# Altium integrated library EFR_Lib.IntLib: 430 symbols (part 1 of 6) (continued)
## CON-04-WE-MPC3-66200411122
designator J?, comment 66200411122
WR-MPC3 THT Male Vertical Header, pitch 3mm, 4p; Manufacturer: Würth Elektronik; Contact Resistance: 10mΩ; Insulation Resistance: >1000MΩ; Rated Current: 5A; Working Voltage: 250VAC; ComponentLink1Description: Website Link; ComponentLink1URL: https://www.we-online.com/redexpert/article/66200411122?ad; ComponentLink2Description: Datasheet Link; ComponentLink2URL: https://www.we-online.com/redexpert/spec/66200411122?ad; Manufacturer P/N: 66200411122; Category: Wire-to-Board Connectors; Match Code: WR-MPC3; Mounting Technology: THT; Operating Temperature Max: 105°C; Operating Temperature Min: -40°C; Packaging: Tube; Length: 15.65mm; Width: 5.57mm; Height: 11mm; Gender: Male; Number of Pins: 4; Number of Rows: 1; Orientation: Vertical; Pitch: 3mm
footprint 66200411122 (3.00mm Male Single Row Vertical Header, 4p)
pins: 1, 2, 3, 4

## CON-04-WE-MPC3-66200421122
designator J?, comment WR-MPC3
THT Male Header WR-MPC3, Vertical, Dual Row, pitch 3 mm, 4 pins; Manufacturer P/N: 66200421122; Manufacturer: Würth Elektronik; Pitch: 3 mm; Working Voltage: 250 VAC; Contact Resistance: 10 mOhm; PinNumber: 4; ComponentLink1Description: Manufacturer; ComponentLink1URL: http://www.we-online.de; ComponentLink2Description: Datasheet; ComponentLink2URL: https://katalog.we-online.de/em/datasheet/6620xx21122.pdf; Published Date: September 2018; Operating Temperature: -40 to 105 degC; Packaging: Tube; Gender: Male; Mounting Technology: THT; Orientation: Vertical
footprint CON-04-WE-66200421122 (Dual row Vertical header 04p)
pins: 1, 2, 3, 4

## CON-04-WE-MPC4-64900411122
designator J?, comment 64900411122
WR-MPC4 THT Male Vertical Header, pitch 4.2mm, 4p; Manufacturer: Würth Elektronik; Contact Resistance: 10mΩ; Insulation Resistance: 1000MΩ; Rated Current: 9A; Working Voltage: 600VAC; ComponentLink1Description: Website Link; ComponentLink1URL: https://www.we-online.com/redexpert/article/64900411122?ad; ComponentLink2Description: Datasheet Link; ComponentLink2URL: https://www.we-online.com/redexpert/spec/64900411122?ad; Manufacturer P/N: 64900411122; Category: Wire-to-Board Connectors; Match Code: WR-MPC4; Mounting Technology: THT; Operating Temperature Max: 105°C; Operating Temperature Min: -40°C; Packaging: Tray; Gender: Male; Number of Pins: 4; Number of Rows: 1; Orientation: Vertical; Pitch: 4.2mm
footprint 64900411122
pins: 1, 2, 3, 4

## CON-04-WE-MPC4-64900421122
designator J?, comment MPC4 Vert.
WR-MPC4 4.2mm Male Dual Row Vertical Header, 4p; Manufacturer P/N: 64900421122; Manufacturer: Würth Elektronik; Working Voltage: 600VAC; Contact Resistance: 10mOhm; Pin Number: 4; ComponentLink1Description: Manufacturer; ComponentLink1URL: http://www.we-online.de; ComponentLink2Description: Datasheet; ComponentLink2URL: https://www.we-online.com/catalog/datasheet/64900421122.pdf; Published Date: March 2020; Pitch: 4.2mm; Operating Temperature: -40 to +105degC; Packaging: Tray; Gender: Male; Mounting Technology: THT; Type: Vertical; Row Number: Dual
footprint CON-WE-64900421122 (4.20mm Male Dual Row Vertical Header, 4p)
pins: 1, 2, 3, 4

## CON-04-WE-PHD-62000411821
designator J?, comment PHD
WR-PHD Socket Header, THT, pitch 2mm, Single Row, Vertical, 4p; Manufacturer P/N: 62000411821; Manufacturer: Würth Elektronik; Pin Number: 4; Rated Current: 2A; Working Voltage: 250VAC; Withstanding Voltage: 500VAC; Contact Resistance: 20mOhm; ComponentLink1Description: Manufacturer; ComponentLink1URL: http://www.we-online.de; ComponentLink2Description: Datasheet; ComponentLink2URL: https://www.we-online.com/catalog/datasheet/62000411821.pdf; Published Date: May 2020; Pitch: 2mm; Operating Temperature: -40 to +105degC; Mounting Technology: THT; Packaging: Tube; Gender: Socket Header; Row Number: Single; Orientation: Vertical
footprint CON-04-WE-PHD-62000411821 (Footprint not found)
pins: 1, 2, 3, 4

## CON-04-WE-PHD-62200421121
designator J?, comment PHD, 1.27mm
WR-PHD Pin Header, THT, pitch 1.27mm, Dual Row, Vertical, 4p; Manufacturer P/N: 62200421121; Manufacturer: Würth Elektronik; Pin Number: 4; Rated Current: 1A; Working Voltage: 100VAC; Withstanding Voltage: 500VAC; Contact Resistance: 20mOhm; ComponentLink1Description: Manufacturer; ComponentLink1URL: http://www.we-online.de; ComponentLink2Description: Datasheet; ComponentLink2URL: https://www.we-online.com/catalog/datasheet/62200421121.pdf; Published Date: May 2020; Pitch: 1.27mm; Operating Temperature: -40 to +105degC; Mounting Technology: THT; Packaging: Box; Gender: Pin Header; Row Number: Dual; Orientation: Vertical
footprint CON-04-WE-62200421121 (Pin Header, pitch 1.27 mm, THT, Vertical, dual row, 4p)
pins: 1, 2, 3, 4

## CON-04-WE-TBL-691244510004
designator J?, comment 691244510004
WR-TBL Series 2445 Horizontal Entry Modular, Through Hole, pitch 5.08mm, 4p; Manufacturer: Würth Elektronik; Pin Number: 4; Rated Current: 16A; Working Voltage: 300V; PCB/Cable/Panel: PCB; Modularity: No; ComponentLink1Description: Manufacturer Link; ComponentLink1URL: https://www.we-online.com/redexpert/article/691244510004?ad; ComponentLink2Description: Datasheet; ComponentLink2URL: https://www.we-online.com/redexpert/spec/691244510004?ad; Category: Terminal Blocks; Match Code: WR-TBL; Manufacturer P/N: 691244510004; Mounting Technology: THT; Operating Temperature Max: 120°C; Operating Temperature Min: -30°C; Packaging: Box; Pitch: 5.08mm; Orientation: Horizontal; Application: Rising Cage Clamp
footprint CON-04-WE-691244510004 (Serie 2445 - 5.08 mm _ 4 pins)
pins: 1, 2, 3, 4

## CON-04-WE-WTB-62000411722
designator J?, comment WR-WTB
Male Shrouded Header WR-WTB, THT, Right Angled, pitch 2 mm, 1 x 4 position; Manufacturer: Würth Elektronik; Manufacturer P/N: 62000411722; Pitch: 2mm; Working Voltage: 125VAC; Position: 1x4; Contact Resistance: 20mOhm; PinNumber: 4; Gender: Male; Datasheet URL: https://katalog.we-online.de/em/datasheet/6200xx11722.pdf; Orientation: RightAngled; Mounting Technology: THT; Operating Temperature: -25to85degC; Publisher: WurthElektronik; ComponentLink1Description: Hersteller; ComponentLink1URL: https://katalog.we-online.de/de/em/WTB_2_00_MALE_HORIZONTAL_SHROUDED_HEADER_6200XX11722; ComponentLink2Description: Datenblatt; ComponentLink2URL: https://katalog.we-online.de/em/datasheet/6200xx11722.pdf
footprint CON-04-WE-62000411722 (2.00mm Male Horizontal Shrouded Header, 4p)
pins: 1, 2, 3, 4

## CON-05-EDAC-560-005-420-101
designator J?, comment EDAC 560
THT White Male 560 Series Waterproof Connector with Plastic Pegs, Vertical, Single Row, pitch 2.5 mm, 5 pins; Manufacturer P/N: 560-005-420-101; Pitch: 2.5 mm; Working Voltage: 250 V; Contact Resistance: 15 mOhm; PinNumber: 5; Current: 3A; ComponentLink1Description: Manufacturer; ComponentLink1URL: https://edac.net/series/560; ComponentLink2Description: Datasheet; ComponentLink2URL: https://files.edac.net/edac/content/560/560-005-420-101%20-%20EDAC%20E-SEAL%20Waterproof%20Connector.PDF; Manufacturer: EDAC; Operating Temperature: -40 to 105 °C; Gender: Male; Mounting Technology: THT; Orientation: Vertical; Supplier 1: Mouser; Supplier 2: Digi-Key; Supplier Part Number 1: 587-560-005-420-101; Supplier Part Number 2: 151-1552-ND
footprint CON-05-EDAC_560-005-420-101 (EDAC 560 SERIES WATERPROOF CONNECTOR 5 Pin)
pins: 1, 2, 3, 4, 5

## CON-05-EDAC-560-005-420-301
designator J?, comment EDAC 560
THT Blue Male 560 Series Waterproof Connector with Plastic Pegs, Vertical, Single Row, pitch 2.5 mm, 5 pins; Manufacturer P/N: 560-005-420-301; Pitch: 2.5 mm; Working Voltage: 250 V; Contact Resistance: 15 mOhm; PinNumber: 5; Current: 3A; ComponentLink1Description: Manufacturer; ComponentLink1URL: https://edac.net/series/560; ComponentLink2Description: Datasheet; ComponentLink2URL: https://files.edac.net/edac/content/560/560-005-420-301%20-%20EDAC%20E-SEAL%20Waterproof%20Connector.PDF; Manufacturer: EDAC; Operating Temperature: -40 to 105 °C; Gender: Male; Mounting Technology: THT; Orientation: Vertical; Supplier 1: Mouser; Supplier 2: Digi-Key; Supplier Part Number 1: 587-560-005-420-301; Supplier Part Number 2: 151-1553-ND
footprint CON-05-EDAC_560-005-420-101 (EDAC 560 SERIES WATERPROOF CONNECTOR 5 Pin)
pins: 1, 2, 3, 4, 5

## CON-05-WE-WTB-62000511722
designator J?, comment WR-WTB Horiz.
Male Shrouded Header WR-WTB, THT, Right Angled, pitch 2 mm, 1 x 5 position; Manufacturer: Würth Elektronik; Manufacturer P/N: 62000511722; Pitch: 2mm; Contact Resistance: 20mOhm; Position: 1x5; Working Voltage: 125VAC; PinNumber: 5; Package Reference: 62000511722; Gender: Male; Packaging: Bag; Datasheet URL: https://katalog.we-online.de/em/datasheet/6200xx11722.pdf; Orientation: RightAngled; Manufacturer URL: http://www.we-online.de; Operating Temperature: -25to85degC; Publisher: WurthElektronik; Mounting Technology: THT
footprint CON-05-62000511722 (2.00mm Male Horizontal Shrouded Header, 5p)
pins: 1, 2, 3, 4, 5

## CON-06-Amphenol-67997-106HLF
designator J?, comment HDR 2x3
CONN HEADER 6POS .100 STR 30AU; Manufacturer: Amphenol FCI; Manufacturer P/N: 67997-106HLF; Number of Contacts: 6; Insulation Resistance: 5GR; Max Voltage Rating (AC): 1.5kV; Gender: Male; Current Rating: 3A; Connector Type: Male Pin; Pitch: 2.54mm; Row Spacing: 0.1inch; Contact Post Length: 3.05mm; RoHS: Yes; Category: Headers and Wire Housings; Stock 1: 1387; Pricing 1: 1=1,78000, 10=1,61400, 100=1,38370, 500=1,15308, 1000=0,98835, 5000=0,87634, 10000=0,85657 (USD); Mounting Technology: THT; Contact Plating: Gold,GXT; Housing Color: Black; Contact Material: Bronze; Color: Black; Housing Material: Thermoplastic; Min Operating Temperature: -65°C; Max Operating Temperature: 125°C; Termination: Through Hole; Number of Rows: 2; Orientation: Straight; Number of Positions: 6; Packaging: Bulk; Package Quantity: 100; Contact Gender: Male; Voltage Rating: 1.5kV; Length: 7.62mm; Contact Mating Length: 0.23inch; Depth: 4.83mm; Radiation Hardening: No; Lead Free: Lead Free; REACH SVHC: No SVHC; Flammability Rating: UL94 V-0; ComponentLink1URL: https://datasheet.ciiva.com/5153/67996-222463-5153820.pdf?src-supplier=Mouser; ComponentLink1Description: https://datasheet.ciiva.com/5153/67996-222463-5153820.pdf?src-supplier=Mouser; ComponentLink2URL: https://datasheet.ciiva.com/16726/67996-16726286.pdf?src-supplier=Avnet+Europe; ComponentLink2Description: https://datasheet.ciiva.com/16726/67996-16726286.pdf?src-supplier=Avnet+Europe; ComponentLink3URL: https://datasheet.ciiva.com/722/67996-722044.pdf?src-supplier=Digi-Key; ComponentLink3Description: https://datasheet.ciiva.com/722/67996-722044.pdf?src-supplier=Digi-Key; ComponentLink4URL: https://datasheet.ciiva.com/10149/67996-10149221.pdf?src-supplier=Avnet; ComponentLink4Description: https://datasheet.ciiva.com/10149/67996-10149221.pdf?src-supplier=Avnet; ComponentLink5URL: https://datasheet.ciiva.com/46393/1876884-46393067.pdf?src-supplier=Element14; ComponentLink5Description: https://datasheet.ciiva.com/46393/1876884-46393067.pdf?src-supplier=Element14; Supplier 1: Digi-Key; Supplier Part Number 1: 609-3393-ND
footprint HDR_2x3_2.55mm
pins: 1, 2, 3, 4, 5, 6

## CON-06-SAMTEC-FTS-103-01-X-D
designator J?, comment FTS-103-01-X-D
Micro Low Profile Header Strips; Manufacturer: Samtec Inc.; Package: None; Manufacturer P/N: FTS-103-01-X-D; Value: *; Availability: Unavailable; Price: None; ComponentLink1Description: Manfacturer; ComponentLink1URL: https://www.samtec.com/products/fts-103-01-l-d; ComponentLink2Description: Datasheet; ComponentLink2URL: https://suddendocs.samtec.com/prints/fts-1xx-xx-xx-xx-xx-x-xx-mkt.pdf; ComponentLink3Description: Product Series; ComponentLink3URL: https://www.samtec.com/products/fts; Mounting Technology: THT
footprint CON-06-SAMTEC-FTS-103-01-X-D
pins: 1, 2, 3, 4, 5, 6

## CON-06-WE-MPC3-66200611022
designator J?, comment 66200611022
WR-MPC3 THT Male Right Angled Header with Plastic Pegs, pitch 3mm, 6p; Manufacturer: Wurth Elektronik; Contact Resistance: 10mOhm; Insulation Resistance: >1000MOhm; Rated Current: 5A; Working Voltage: 250V (AC); Match Code: WR-MPC3; ComponentLink1Description: Website Link; ComponentLink1URL: https://www.we-online.com/redexpert/article/66200611022?ad; ComponentLink2Description: Datasheet Link; ComponentLink2URL: https://www.we-online.com/redexpert/spec/66200611022?ad; Mount: Through Hole; Operating Temperature Max: 105°C; Operating Temperature Min: -40°C; Packaging: Tube; Length: 21.65mm; Width: 9.9mm; Height: 5.57mm; Gender: Male; Number of Pins: 6; Number of Rows: 1; Orientation: Right Angled; Pitch: 3mm; Manufacturer P/N: 66200611022
footprint 66200611022 (3.00mm Male Single Row Angled Header with Plastic Pegs, 6p)
pins: 1, 2, 3, 4, 5, 6

## CON-06-WE-MPC3-66200621122
designator J?, comment WR-MPC3 Vert.
THT Male Header WR-MPC3, Vertical, Dual Row, pitch 3 mm, 6 pins; Manufacturer: Würth Elektronik; Manufacturer P/N: 66200621122; Pitch: 3mm; PinNumber: 6; Working Voltage: 250VAC; Contact Resistance: 10mOhm; Datasheet URL: https://katalog.we-online.de/em/datasheet/6620xx21122.pdf; Orientation: Vertical; Publisher: WurthElektronik; Package Reference: 66200621122; Operating Temperature: -40to105degC; Gender: Male; Manufacturer URL: http://www.we-online.de; Mounting Technology: THT; ComponentLink1Description: Hersteller; ComponentLink1URL: https://katalog.we-online.de/de/em/MPC3_3_00_MALE_DUAL_ROW_VERTICAL_HEADER_6620XX21122; ComponentLink2Description: Datenblatt; ComponentLink2URL: https://katalog.we-online.de/em/datasheet/6620xx21122.pdf
footprint CON-06-WE-66200621122 (Dual row Vertical header 06p)
pins: 1, 2, 3, 4, 5, 6

## CON-06-WE-MPC4-64900621122
designator J?, comment WR-MPC4 Vert.
THT Male Header WR-MPC4, Vertical, Dual Row, pitch 4.2 mm, 6 pins; Manufacturer P/N: 64900621122; Manufacturer: Würth Elektronik; Pitch: 4.2 mm; Working Voltage: 600 VAC; Contact Resistance: 10 mOhm; PinNumber: 6; ComponentLink1Description: Manufacturer; ComponentLink1URL: http://www.we-online.de; ComponentLink2Description: Datasheet; ComponentLink2URL: https://katalog.we-online.de/em/datasheet/6490xx21122.pdf; Published Date: September 2018; Operating Temperature: -40 to 105 degC; Packaging: Tray; Gender: Male; Mounting Technology: THT; Orientation: Vertical; Resistance: *; Tolerance: *; Capacitance: *; Power (W): *; Current (A): *; Voltage (V): *; Value: *; Parameter 3: *
footprint CON-06-WE-64900621122 (4.20mm Male Dual Row Vertical Header, 6p)
pins: 1, 2, 3, 4, 5, 6

## CON-06-WE-PHD-62000611821
designator J?, comment WR-PHD 2mm
WR-PHD Socket Header, THT, Vertical, pitch 2mm, 1 Row, 6P; Manufacturer P/N: 62000611821; Manufacturer: Würth Elektronik; Contact Resistance: 20mΩ; Rated Current: 2A; Working Voltage: 250V; Withstanding Voltage: 500V; ComponentLink1Description: Website Link; ComponentLink1URL: https://www.we-online.com/redexpert/article/62000611821?ad; ComponentLink2Description: Datasheet Link; ComponentLink2URL: https://www.we-online.com/redexpert/spec/62000611821?ad; Category: Board-to-Board Connectors; Match Code: WR-PHD; Mounting Technology: THT; Operating Temperature Max: 105°C; Operating Temperature Min: -40°C; Packaging: Tube; Gender: Socket Header; Number of Pins: 6; Number of Rows: 1; Orientation: Vertical; Pitch: 2mm
footprint 62000611821
pins: 1, 2, 3, 4, 5, 6

## CON-07-WE-MPC3-66200711022
designator J?, comment 66200711022  (value not drawn)
WR-MPC3 THT Male Right Angled Header with Plastic Pegs, pitch 3mm, 7p; Manufacturer: Wurth Elektronik; Contact Resistance: 10mOhm; Insulation Resistance: >1000MOhm; Rated Current: 5A; Working Voltage: 250V (AC); Manufacturer P/N: 66200711022; Match Code: WR-MPC3; ComponentLink1Description: Website Link; ComponentLink1URL: https://www.we-online.com/redexpert/article/66200711022?ad; ComponentLink2Description: Datasheet Link; ComponentLink2URL: https://www.we-online.com/redexpert/spec/66200711022?ad; Mount: Through Hole; Operating Temperature Max: 105°C; Operating Temperature Min: -40°C; Packaging: Tube; Length: 24.65mm; Width: 9.9mm; Height: 5.57mm; Gender: Male; Number of Pins: 7; Number of Rows: 1; Orientation: Right Angled; Pitch: 3mm
footprint 66200711022 (3.00mm Male Single Row Angled Header with Plastic Pegs, 7p)
pins: 1, 2, 3, 4, 5, 6, 7

## CON-08-WE-MPC3-66200811024
designator J?, comment 66200811024  (value not drawn)
WR-MPC3 THT Male Header Single Row Right Angled with Plastic Pegs (Selective Gold), pitch 3mm, 8p; Manufacturer: Wurth Elektronik; Contact Resistance: 10mOhm; Insulation Resistance: >1000MOhm; Rated Current: 5A; Working Voltage: 250V (AC); Manufacturer P/N: 66200811024; Match Code: WR-MPC3; ComponentLink1Description: Website Link; ComponentLink1URL: https://www.we-online.com/redexpert/article/66200811024?ad; ComponentLink2Description: Datasheet Link; ComponentLink2URL: https://www.we-online.com/redexpert/spec/66200811024?ad; Mount: Through Hole; Operating Temperature Max: 105°C; Operating Temperature Min: -40°C; Packaging: Tube; Gender: Male; Number of Pins: 8; Number of Rows: 1; Orientation: Right Angled; Pitch: 3mm
footprint 66200811024 (3.00mm Male Single Row Angled Header with Plastic Pegs, 8p)
pins: 1, 2, 3, 4, 5, 6, 7, 8

## CON-08-WE-MPC3-66200821022
designator J?, comment WR-MPC3 Horiz.
THT Male Header WR-MPC3, with Snap-in Plastic Pegs, Right Angled, Dual Row, pitch 3 mm, 8 pins; Manufacturer P/N: 66200821022; Manufacturer: Würth Elektronik; Pitch: 3 mm; Working Voltage: 250 VAC; Contact Resistance: 10 mOhm; Pin Number: 8; ComponentLink1Description: Manufacturer; ComponentLink1URL: http://www.we-online.de; ComponentLink2Description: Datasheet; ComponentLink2URL: https://katalog.we-online.de/em/datasheet/6620xx21022.pdf; Published Date: September 2018; Operating Temperature: -40 to 105 degC; Packaging: Tube; Gender: Male; Mounting Technology: THT; Orientation: Right Angled
footprint CON-08-WE-66200821022 (Dual row Right angle header With plastic peg 08p)
pins: 1, 2, 3, 4, 5, 6, 7, 8

## CON-08-WE-MPC3-66200821122
designator J?, comment WR-MPC3 Vert.
THT Male Header WR-MPC3, Vertical, Dual Row, pitch 3 mm, 8 pins; Manufacturer P/N: 66200821122; Manufacturer: Würth Elektronik; Pitch: 3 mm; Working Voltage: 250 VAC; Contact Resistance: 10 mOhm; Pin Number: 8; ComponentLink1Description: Manufacturer; ComponentLink1URL: https://www.we-online.de/katalog/de/MPC3_3_00_MALE_DUAL_ROW_VERTICAL_HEADER_6620XX21122/#66200821122; ComponentLink2Description: Datasheet; ComponentLink2URL: https://katalog.we-online.de/em/datasheet/6620xx21122.pdf; Operating Temperature: -40 to 105 degC; Packaging: Tube; Gender: Male; Mounting Technology: THT; Orientation: Vertical; Supplier 1: Mouser; Supplier Part Number 1: 710-66200821122
footprint CON-08-WE-66200821122 (Dual row Vertical header 08p)
pins: 1, 2, 3, 4, 5, 6, 7, 8

## CON-08-WE-MPC4-64900821122
designator J?, comment WR-MPC4 Vert.
THT Male Header WR-MPC4, Vertical, Dual Row, pitch 4.2 mm, 8 pins; Manufacturer P/N: 64900821122; Manufacturer: Würth Elektronik; Pitch: 4.2 mm; Working Voltage: 600 VAC; Contact Resistance: 10 mOhm; PinNumber: 8; ComponentLink1Description: Manufacturer; ComponentLink1URL: http://www.we-online.de; ComponentLink2Description: Datasheet; ComponentLink2URL: https://katalog.we-online.de/em/datasheet/6490xx21122.pdf; Published Date: September 2018; Operating Temperature: -40 to 105 degC; Gender: Male; Mounting Technology: THT; Orientation: Vertical
footprint CON-08-WE-64900821122 (Footprint not found)
pins: 1, 2, 3, 4, 5, 6, 7, 8

## CON-08-WE-WTB-62000811722
designator J?, comment WR-WTB Horiz.
WR-WTB THT Male Horizontal Shrouded Header, pitch 2mm, 8pins; Manufacturer P/N: 62000811722; Manufacturer: Würth Elektronik; Contact Resistance: 20mOhm; Rated Current: 2A; Working Voltage: 125VAC; Withstanding Voltage: 800VAC; ComponentLink1Description: Website Link; ComponentLink1URL: https://www.we-online.com/redexpert/article/62000811722?ad; ComponentLink2Description: Datasheet Link; ComponentLink2URL: https://www.we-online.com/redexpert/spec/62000811722?ad; Category: Wire-to-Board Connectors; Match Code: WR-WTB; Mounting Technology: THT; Operating Temperature Max: 85°C; Operating Temperature Min: -25°C; Packaging: Bag; Length: 18mm; Width: 7.6mm; Height: 4.5mm; Gender: Male; Number of Pins: 8; Number of Rows: 1; Orientation: Horizontal; Pitch: 2mm
footprint 61900819521 (2.54mm Male Right Angled Locking Header Top Locking, 8p)
pins: 1, 2, 3, 4, 5, 6, 7, 8

## CON-08-WE-WTB-62400821722
designator J?, comment WR-WTB vert.
WR-WTB THT Male Horizontal Shrouded Header with positive locking, Dual Row, pitch 2mm, 8pins; Manufacturer P/N: 62400821722; Manufacturer: Würth Elektronik; Contact Resistance: 20mOhm; Rated Current: 3A; Working Voltage: 250VAC; Withstanding Voltage: 1000VAC; ComponentLink1Description: Website Link; ComponentLink1URL: https://www.we-online.com/redexpert/article/62400821722?ad; ComponentLink2Description: Datasheet Link; ComponentLink2URL: https://www.we-online.com/redexpert/spec/62400821722?ad; Category: Wire-to-Board Connectors; Match Code: WR-WTB; Mounting Technology: THT; Operating Temperature Max: 85°C; Operating Temperature Min: -25°C; Packaging: Tube; Length: 11.4mm; Width: 14.5mm; Height: 11.7mm; Gender: Male; Number of Pins: 8; Number of Rows: 2; Orientation: Horizontal; Pitch: 2mm
footprint 62400821722
pins: 1, 2, 3, 4, 5, 6, 7, 8

## CON-09-DSUB-WE-618009231121
designator J?, comment DSUB Angled
WR-DSUB 8.08mm Female PCB Connector with Hex Screw, Angled, 9p; Manufacturer P/N: 618009231121; Manufacturer: Würth Elektronik; Pin Number: 9; Rated Current: 3A; Contact Resistance: 30mOhm; Working Voltage: 125VAC; Withstanding Voltage: 1000VAC; ComponentLink1Description: Manufacturer; ComponentLink1URL: https://www.we-online.com/en/components/products/DSUB_FEMALE_ANGLED_PCB_CONNECTOR_W_HEX_SCREW_8_08MM_6180XX231121#618009231121; ComponentLink2Description: Datasheet; ComponentLink2URL: https://www.we-online.com/catalog/datasheet/618009231121.pdf; Published Date: April 2021; Type: Angled; Operating Temperature: -55 to +105degC; Mounting Technology: THT; Gender: Female; Packaging: Tray
footprint CON-09-DSUB-WE-618009231121 (9 pins, right angled, 8.08mm, with hex screw)
pins: 1, 2, 3, 4, 5, 6, 7, 8, 9, M1, M2

## CON-10-WE-BHD-62501021621
designator J?, comment WR-BHD Vert.
Male Box Header WR-BHD with long lever, THT, Vertical, pitch 2.00 mm, 10 pins; Manufacturer P/N: 62501021621; Manufacturer: Würth Elektronik; PinNumber: 10; Pitch: 2.00 mm; Working Voltage: 250 VAC; Withstanding Voltage: 500 VAC; Contact Resistance: 20 mOhm; Current (A): 3; ComponentLink1Description: Manufacturer; ComponentLink1URL: http://www.we-online.de; ComponentLink2Description: Datasheet; ComponentLink2URL: https://katalog.we-online.de/em/datasheet/6250xx21621.pdf; Operating Temperature: -40 to 125 degC; Packaging: Tray; Gender: Male; Mounting Technology: THT; Orientation: Vertical; Resistance: 20 mOhm; Capacitance: *; Tolerance: *; Power (W): *; Voltage (V): 250 VAC; Typ: *
footprint CON-10-WE-BHD-62501021621 (2.00mm Male Box Header, 10p)
pins: 1, 2, 3, 4, 5, 6, 7, 8, 9, 10

## CON-10-WE-BHD-62501021721
designator J?, comment WR-BHD Angled
WR-BHD Male Box Header, THT Right Angle, pitch 2mm, 2 Row, 10 pin; Manufacturer P/N: 62501021721; Manufacturer: Würth Elektronik; Contact Resistance: 20mOhm; Insulation Resistance: 1000MOhm; Rated Current: 2A; Working Voltage: 250V; Withstanding Voltage: 500V; Category: Wire-to-Board Connectors; Match Code: WR-BHD; ComponentLink1Description: Website Link; ComponentLink1URL: https://www.we-online.com/redexpert/article/62501021721?ad; ComponentLink2Description: Datasheet Link; ComponentLink2URL: https://www.we-online.com/redexpert/spec/62501021721?ad; Mounting Technology: THT; Operating Temperature Max: 105°C; Operating Temperature Min: -40°C; Packaging: Tray; Length: 17.25mm; Width: 8.45mm; Height: 5.5mm; Gender: Male; Number of Pins: 10; Number of Rows: 2; Orientation: Right Angle; Pitch: 2mm
footprint CON-10-WE-BHD-62501021721 (2.00mm Male Angled Box Header, 10p)
pins: 1, 2, 3, 4, 5, 6, 7, 8, 9, 10

## CON-10-WE-BHD-62531020621
designator J?, comment WR-BHD Vert.
Male Box Header WR-BHD, SMT, Vertical, pitch 2.00 mm, 10 pins; Manufacturer P/N: 62531020621; Manufacturer: Würth Elektronik; PinNumber: 10; Pitch: 2.00 mm; Working Voltage: 250 VAC; Withstanding Voltage: 500 VAC; Contact Resistance: 20 mOhm; Current (A): 2; ComponentLink1Description: Manufacturer; ComponentLink1URL: http://www.we-online.de; ComponentLink2Description: Datasheet; ComponentLink2URL: https://katalog.we-online.de/em/datasheet/6253xx20621.pdf; Operating Temperature: -40 to 105 degC; Packaging: Tape and Reel; Gender: Male; Mounting Technology: SMT; Orientation: Vertical; Resistance: 20 mOhm; Capacitance: *; Tolerance: *; Value: *; Voltage (V): 250 VAC; Power (W): *; Typ: *
footprint CON-10-WE-BHD-62531020621 (2.00mm Male SMT Box Header, 10p)
pins: 1, 2, 3, 4, 5, 6, 7, 8, 9, 10

## CON-10-WE-MM-690367291076
designator J?, comment WR-MM+L
WR-MM MiniModule Connector, Female, SMT, Vertical, pitch 2.54mm, 10pins; Manufacturer P/N: 690367291076; Manufacturer: Würth Elektronik; PinNumber: 10; Insulation Resistance: >1000MOhm; Rated Current: 1.5A; Working Voltage: 100VAC; Withstanding Voltage: 500VAC; Contact Resistance: 10mOhm; Resistance: 0R010; Current (A): 1.5; Voltage (V): 100; ComponentLink1Description: Manufacturer; ComponentLink1URL: http://www.we-online.de; ComponentLink2Description: Datasheet; ComponentLink2URL: https://katalog.we-online.de/em/datasheet/690367291076.pdf; Published Date: June 2019; Publisher: Wurth Elektronik; Pitch: 2.54mm; Operating Temperature: -40 to +105degC; Mounting Technology: SMT; Packaging: Tape and Reel; Gender: Female; Orientation: Vertical; Capacitance: *; Power (W): *; Value: =PartNumber; Tolerance: *; Type: *
footprint CON-10-WE-690367291076 (MiniModule Connectors, PCB Type, Female, SMT, Vertical, 10p)
pins: 1, 2, 3, 4, 5, 6, 7, 8, 9, 10

## CON-10-WE-MPC3-66201011022
designator J?, comment WR-MPC3
THT Male Header WR-MPC3, with Snap-in Plastic Pegs, Right Angled, Single Row, pitch 3 mm, 10 pins; Manufacturer P/N: 66201011022; Manufacturer: Würth Elektronik; Pitch: 3 mm; Working Voltage: 250 VAC; Contact Resistance: 10 mOhm; PinNumber: 10; ComponentLink1Description: Manufacturer; ComponentLink1URL: http://www.we-online.de; ComponentLink2Description: Datasheet; ComponentLink2URL: https://katalog.we-online.de/em/datasheet/6620xx11022.pdf; Published Date: September 2018; Operating Temperature: -40 to 105 degC; Packaging: Tube; Gender: Male; Mounting Technology: THT; Orientation: Right Angled
footprint CON-10-WE-66201011022 (3.00mm Male Single Row Angled Header with Plastic Pegs, 10p)
pins: 1, 2, 3, 4, 5, 6, 7, 8, 9, 10

## CON-10-WE-MPC3-66201021122
designator J?, comment Vert.
THT Male Header WR-MPC3, Vertical, Dual Row, pitch 3 mm, 10 pins; Manufacturer P/N: 66201021122; Manufacturer: Würth Elektronik; Pitch: 3 mm; Working Voltage: 250 VAC; Contact Resistance: 10 mOhm; Pin Number: 10; ComponentLink1Description: Manufacturer; ComponentLink1URL: https://www.we-online.com/catalog/en/MPC3_3_00_MALE_DUAL_ROW_VERTICAL_HEADER_6620XX21122#66201021122; ComponentLink2Description: Datasheet; ComponentLink2URL: https://katalog.we-online.de/em/datasheet/6620xx21122.pdf; Published Date: September 2018; Operating Temperature: -40 to 105 degC; Packaging: Tube; Gender: Male; Mounting Technology: THT; Orientation: Vertical
footprint CON-10-WE-66201021122 (Dual row Vertical header 10p)
pins: 1, 2, 3, 4, 5, 6, 7, 8, 9, 10

## CON-10-WE-MPC4-64901021122
designator J?, comment WR-MPC4 Vert.
THT Male Header WR-MPC4, Vertical, Dual Row, pitch 4.2 mm, 10 pins; Manufacturer P/N: 64901021122; Manufacturer: Würth Elektronik; Pitch: 4.2 mm; Working Voltage: 600 VAC; Contact Resistance: 10 mOhm; PinNumber: 10; ComponentLink1Description: Manufacturer; ComponentLink1URL: http://www.we-online.de; ComponentLink2Description: Datasheet; ComponentLink2URL: https://katalog.we-online.de/em/datasheet/6490xx21122.pdf; Published Date: September 2018; Operating Temperature: -40 to 105 degC; Packaging: Tray; Gender: Male; Mounting Technology: THT; Orientation: Vertical
footprint CON-10-WE-64901021122 (4.20mm Male Dual Row Vertical Header, 10p)
pins: 1, 2, 3, 4, 5, 6, 7, 8, 9, 10

## CON-10-WE-WTB-62401021622
designator J?, comment WR-WTB THT Vert.
WR-WTB THT Male Vertical Shrouded Header with positive locking, Dual Row, pitch 2mm, 10p; Manufacturer: Würth Elektronik; Manufacturer P/N: 62401021622; Pin Number: 10; Contact Resistance: 20mOhm; Rated Current: 3A; Withstanding Voltage: 1000VAC; Working Voltage: 250VAC; ComponentLink1Description: Manufacturer; ComponentLink1URL: https://www.we-online.com/catalog/en/WTB_2_00_MALE_DUAL_ROW_VERTICAL_SHROUDED_HEADER_W_POSITIVE_LOCKING_6240XX21622#62401021622; ComponentLink2Description: Datasheet; ComponentLink2URL: https://www.we-online.com/catalog/datasheet/62401021622.pdf; Pitch: 2mm; Published Date: January 2020; Mounting Technology: THT; Packaging: Tube; Operating Temperature: -25 to +85degC; Gender: Male; Type: Vertical
footprint CON-10-WE-62401021622 (2.00mm Male Dual Row Vertical Shrouded Header with positive locking, 10p)
pins: 1, 2, 3, 4, 5, 6, 7, 8, 9, 10

## CON-10-WE-WTB-62401021722
designator J?, comment WR-WTB THT Horiz.
WR-WTB THT Male Horizontal Shrouded Header with positive locking, Dual Row, pitch 2mm, 10p; Manufacturer: Würth Elektronik; Manufacturer P/N: 62401021722; Pin Number: 10; Contact Resistance: 20mOhm; Rated Current: 3A; Withstanding Voltage: 1000VAC; Working Voltage: 250VAC; ComponentLink1Description: Manufacturer; ComponentLink1URL: https://www.we-online.com/catalog/en/WTB_2_00_MALE_DUAL_ROW_HORIZONTAL_SHROUDED_HEADER_W_POSITIVE_LOCKING_6240XX21722#62401021722; ComponentLink2Description: Datasheet; ComponentLink2URL: https://www.we-online.com/catalog/datasheet/62401021722.pdf; Pitch: 2mm; Published Date: January 2020; Mounting Technology: THT; Packaging: Tube; Operating Temperature: -25 to +85degC; Gender: Male; Type: Horizontal
footprint CON-10-WE-62401021722 (2.00mm Male Dual Row Horizontal Shrouded Header with positive locking, 10p)
pins: 1, 2, 3, 4, 5, 6, 7, 8, 9, 10

## CON-12-WE-MM-690367291276
designator J?, comment WR-MM+L
WR-MM MiniModule Connector, Female, SMT, Vertical, pitch 2.54mm, 12pins; Manufacturer P/N: 690367291276; Manufacturer: Würth Elektronik; PinNumber: 12; Insulation Resistance: >1000MOhm; Rated Current: 1.5A; Working Voltage: 100VAC; Withstanding Voltage: 500VAC; Contact Resistance: 10mOhm; Voltage (V): 100; Current (A): 1,5; Resistance: 0R010; ComponentLink1Description: Manufacturer; ComponentLink1URL: http://www.we-online.de; ComponentLink2Description: Datasheet; ComponentLink2URL: https://katalog.we-online.de/em/datasheet/690367291276.pdf; Published Date: June 2019; Publisher: Wurth Elektronik; Pitch: 2.54mm; Operating Temperature: -40 to +105degC; Mounting Technology: SMT; Packaging: Tape and Reel; Gender: Female; Orientation: Vertical; Value: =PartNumber; Capacitance: *; Power (W): *; Tolerance: *; Type: *
footprint CON-12-WE-690367291276 (MiniModule Connectors, PCB Type, Female, SMT, Vertical, 12p)
pins: 1, 2, 3, 4, 5, 6, 7, 8, 9, 10, 11, 12

## CON-12-WE-MPC3-66201221122
designator J?, comment WR-MPC3
THT Male Header WR-MPC3, Vertical, Dual Row, pitch 3 mm, 12 pins; Manufacturer P/N: 66201221122; Manufacturer: Würth Elektronik; Pitch: 3 mm; Working Voltage: 250 VAC; Contact Resistance: 10 mOhm; PinNumber: 12; ComponentLink1Description: Manufacturer; ComponentLink1URL: http://www.we-online.de; ComponentLink2Description: Datasheet; ComponentLink2URL: https://katalog.we-online.de/em/datasheet/6620xx21122.pdf; Published Date: September 2018; Operating Temperature: -40 to 105 degC; Packaging: Tube; Gender: Male; Mounting Technology: THT; Orientation: Vertical
footprint CON-12-WE-66201221122 (Dual row Vertical header 12p)
pins: 1, 2, 3, 4, 5, 6, 7, 8, 9, 10, 11, 12

## CON-12-WE-MPC4-64901221122
designator J?, comment WR-MPC4
THT Male Header WR-MPC4, Vertical, Dual Row, pitch 4.2 mm, 12 pins; Manufacturer P/N: 64901221122; Manufacturer: Würth Elektronik; Contact Resistance: 10mOhm; Pitch: 4.2mm; Working Voltage: 600VAC; PinNumber: 12; Mounting Technology: THT; Publisher: WurthElektronik; Operating Temperature: -40to105degC; Gender: Male; Package Reference: 64901221122; Datasheet URL: https://katalog.we-online.de/em/datasheet/6490xx21122.pdf; Orientation: Vertical; ComponentLink1Description: Datenblatt; ComponentLink1URL: https://katalog.we-online.de/em/datasheet/64901221122.pdf; ComponentLink2Description: Hersteller; ComponentLink2URL: https://katalog.we-online.de/de/em/MPC4_4_20_MALE_DUAL_ROW_VERTICAL_HEADER_6490XX21122
footprint CON-12-WE-64901221122 (Footprint not found)
pins: 1, 2, 3, 4, 5, 6, 7, 8, 9, 10, 11, 12

## CON-12-WE-WTB-62401221622
designator J?, comment WTB Vert. 2mm
WR-WTB THT Male Vertical Shrouded Header with positive locking, Dual Row, pitch 2mm, 12p; Manufacturer: Würth Elektronik; Manufacturer P/N: 62401221622; Pin Number: 12; Contact Resistance: 20mOhm; Rated Current: 3A; Withstanding Voltage: 1000VAC; Working Voltage: 250VAC; ComponentLink1Description: Manufacturer; ComponentLink1URL: http://www.we-online.de; ComponentLink2Description: Datasheet; ComponentLink2URL: https://www.we-online.com/catalog/datasheet/62401221622.pdf; Pitch: 2mm; Published Date: January 2020; Mounting Technology: THT; Packaging: Tube; Operating Temperature: -25 to +85degC; Gender: Male; Type: Vertical
footprint CON-12-WE-62401221622 (2.00mm Male Dual Row Vertical Shrouded Header with positive locking, 12p)
footprint CON-12-WE-WTB-62401221722 (2.00mm Male Dual Row Horizontal Shrouded Header with positive locking, 12p)
pins: 1, 2, 3, 4, 5, 6, 7, 8, 9, 10, 11, 12